# Altium footprint library IC.PcbLib: 386 footprints (part 19 of 30)
Each footprint in its own frame and in the unit in brackets; x right, y up, seen from the top. Pads: shape width x height; smd on the part's side, far side on the other; paste and mask are expansions set on the pad; w line width, h text height; cw(c..) or ccw(c..) is an arc to the next point about the centre after c.
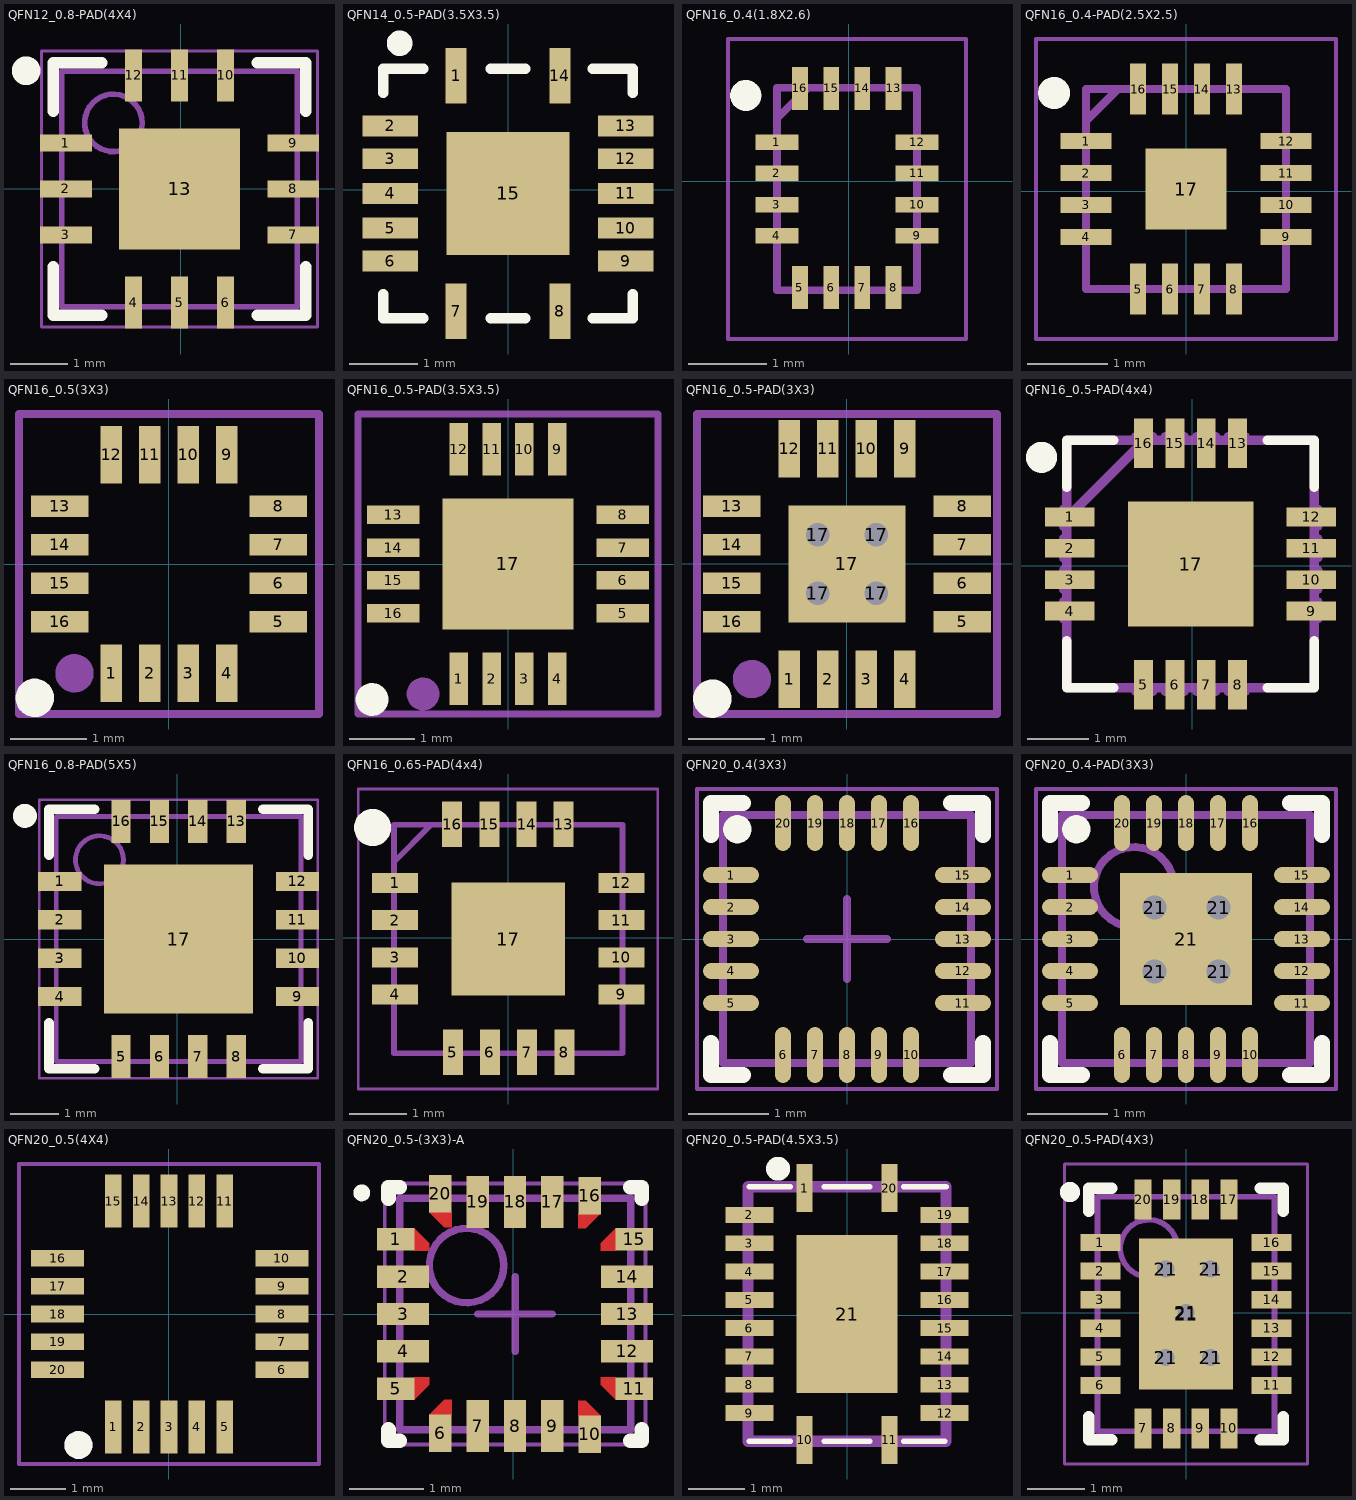
[diagram p18: the footprints below, top view; thin cyan lines are the x and y axes]

## QFN12_0.8-PAD(4X4) [mm]
height 0.254
pads (13):
  rect 0.9x0.3 smd: 1(-2.002,0.8) 2(-2.002,0) 3(-2.002,-0.8) 7(1.951,-0.8) 8(1.951,0) 9(1.951,0.8)
  rect 0.3x0.9 smd: 4(-0.825,-1.976) 5(-0.025,-1.976) 6(0.775,-1.976) 10(0.775,1.976) 11(-0.025,1.976) 12(-0.825,1.976)
  rect 2.1x2.1 smd: 13(-0.025,0)
Top Overlay:
  circle w0.25: c-2.692,2.057 r0.125
  lines w0.2: -2.225,-1.35 -2.225,-2.2 -1.375,-2.2 ; -2.225,1.35 -2.225,2.2 -1.375,2.2 ; 1.325,-2.2 2.175,-2.2 2.175,-1.35 ; 1.325,2.2 2.175,2.2 2.175,1.35
Mechanical 13:
  circle w0.1: c-1.175,1.15 r0.5
  lines w0.1: -2.075,-2.05 -2.075,2.05 2.025,2.05 2.025,-2.05 -2.075,-2.05
Mechanical 15:
  lines w0.05: -2.425,-2.4 -2.425,2.4 2.375,2.4 2.375,-2.4 -2.425,-2.4
  lines w0.1: -0.525,0 0.475,0 ; -0.025,-0.5 -0.025,0.5
3D body "QFN80P400X400X80_HS-13N.step": height 0.8, standoff 0, extent -2.035,-2.01 1.985,2.01

## QFN14_0.5-PAD(3.5X3.5) [mil]
pads (15):
  rect 12x32 smd: 1(-30,66) 7(-30,-70) 8(30,-70) 14(30,66)
  rect 32x12 smd: 2(-68,37) 3(-68,18) 4(-68,-2) 5(-68,-22) 6(-68,-41) 9(68,-41) 10(68,-22) 11(68,-2) 12(68,18) 13(68,37)
  rect 71x71 smd: 15(0,-2)
Top Overlay:
  circle w9.84: c-62.57,84.7 r2.45
  lines w6: -72,-60 -72,-74 -49,-74 ; -72,56 -72,70 -49,70 ; -10,-74 10,-74 ; -10,70 10,70 ; 49,-74 72,-74 72,-60 ; 49,70 72,70 72,56
3D body: height 31.5, standoff 0, extent -70,-70 70,70
3D body: height 32.28, standoff 15.75, extent -59.76,40.18 -40.15,59.83

## QFN16_0.4(1.8X2.6) [mm]
pads (16):
  rect 0.55x0.2 smd: 1(-0.925,0.498) 2(-0.925,0.098) 3(-0.925,-0.302) 4(-0.925,-0.702) 9(0.875,-0.702) 10(0.875,-0.302) 11(0.875,0.098) 12(0.875,0.498)
  rect 0.2x0.55 smd: 5(-0.629,-1.368) 6(-0.229,-1.368) 7(0.171,-1.368) 8(0.571,-1.368) 13(0.571,1.19) 14(0.171,1.19) 15(-0.229,1.19) 16(-0.629,1.19)
Top Overlay:
  circle w0.2: c-1.325,1.098 r0.1
Mechanical 13:
  lines w0.1: -0.925,0.798 -0.525,1.198 ; -0.925,-1.402 -0.925,1.198 0.875,1.198 0.875,-1.402 -0.925,-1.402
Mechanical 15:
  lines w0.05: -1.55,-2.027 -1.55,1.823 1.5,1.823 1.5,-2.027 -1.55,-2.027
3D body "TS3A44159RSVR.stp": height 0.55, standoff 0, extent -0.975,-1.452 0.925,1.248

## QFN16_0.4-PAD(2.5X2.5) [mm]
height 1
pads (17):
  rect 0.635x0.2 smd: 1(-1.25,0.625) 2(-1.25,0.225) 3(-1.25,-0.175) 4(-1.25,-0.575) 9(1.25,-0.575) 10(1.25,-0.175) 11(1.25,0.225) 12(1.25,0.625)
  rect 0.2x0.635 smd: 5(-0.6,-1.225) 6(-0.2,-1.225) 7(0.2,-1.225) 8(0.6,-1.225) 13(0.6,1.275) 14(0.2,1.275) 15(-0.2,1.275) 16(-0.6,1.275)
  rect 1.016x1.016 smd: 17(0,0.025)
Top Overlay:
  circle w0.2: c-1.65,1.225 r0.1
Mechanical 13:
  lines w0.1: -1.25,0.875 -0.85,1.275 ; -1.25,-1.225 1.25,-1.225 1.25,1.275 -1.25,1.275 -1.25,-1.225
Mechanical 15:
  lines w0.05: -1.875,-1.85 1.875,-1.85 1.875,1.9 -1.875,1.9 -1.875,-1.85
3D body "SN74HC595BRWNR.stp": height 0.5, standoff 0, extent -1.3,-1.275 1.3,1.325

## QFN16_0.5(3X3) [mm]
pads (16):
  rect 0.28x0.75 smd mask+0.076: 1(-0.75,-1.425) 2(-0.25,-1.425) 3(0.25,-1.425) 4(0.75,-1.425) 9(0.75,1.425) 10(0.25,1.425) 11(-0.25,1.425) 12(-0.75,1.425)
  rect 0.75x0.28 smd mask+0.076: 5(1.425,-0.75) 6(1.425,-0.25) 7(1.425,0.25) 8(1.425,0.75) 13(-1.425,0.75) 14(-1.425,0.25) 15(-1.425,-0.25) 16(-1.425,-0.75)
Top Overlay:
  circle w0.25: c-1.75,-1.745 r0.125
Mechanical 15:
  circle w0.25: c-1.232,-1.425 r0.125
  lines w0.1: -1.956,-1.956 -1.956,1.956 1.956,1.956 1.956,-1.956 -1.956,-1.956
3D body "QFN16-3X3.STEP": height 0.9, standoff 0, extent -1.501,-1.501 1.501,1.501

## QFN16_0.5-PAD(3.5X3.5) [mm]
pads (17):
  rect 0.28x0.8 smd mask+0.076: 1(-0.75,-1.75) 2(-0.25,-1.75) 3(0.25,-1.75) 4(0.75,-1.75) 9(0.75,1.75) 10(0.25,1.75) 11(-0.25,1.75) 12(-0.75,1.75)
  rect 0.8x0.28 smd mask+0.076: 5(1.75,-0.75) 6(1.75,-0.25) 7(1.75,0.25) 8(1.75,0.75) 13(-1.75,0.75) 14(-1.75,0.25) 15(-1.75,-0.25) 16(-1.75,-0.75)
  rect 2x2 smd paste-5: 17(0,0)
Top Overlay:
  circle w0.25: c-2.072,-2.065 r0.125
Top Paste:
  region: 0.94,-0.94 0.94,-0.152 0.152,-0.152 0.152,-0.94
  region: 0.152,0.94 0.152,0.152 0.94,0.152 0.94,0.94
  region: -0.94,0.94 -0.94,0.152 -0.152,0.152 -0.152,0.94
  region: -0.152,-0.94 -0.152,-0.152 -0.94,-0.152 -0.94,-0.94
Mechanical 15:
  circle w0.25: c-1.295,-1.981 r0.125
  lines w0.1: -0.5,0 0.5,0 ; 0,-0.5 0,0.5 ; -2.286,-2.286 -2.286,2.286 2.286,2.286 2.286,-2.286 -2.286,-2.286
3D body "VQFN16-3.5X3.5.STEP": height 1, standoff 0, extent -1.8,-1.8 1.8,1.8

## QFN16_0.5-PAD(3X3) [mm] "QFN, 16-Leads, Body 3.0x3.0mm (max), Pitch 0.50mm, IPC Low Density"
height 0.9
pads (21):
  rect 0.28x0.75 smd mask+0.076: 1(-0.75,-1.5) 2(-0.25,-1.5) 3(0.25,-1.5) 4(0.75,-1.5) 9(0.75,1.5) 10(0.25,1.5) 11(-0.25,1.5) 12(-0.75,1.5)
  rect 0.75x0.28 smd mask+0.076: 5(1.5,-0.75) 6(1.5,-0.25) 7(1.5,0.25) 8(1.5,0.75) 13(-1.5,0.75) 14(-1.5,0.25) 15(-1.5,-0.25) 16(-1.5,-0.75)
  round 0.61 hole 0.305: 17(-0.381,-0.381) 17(-0.381,0.381) 17(0.381,-0.381) 17(0.381,0.381)
  rect 1.524x1.524 smd paste-2: 17(0,0)
Top Overlay:
  circle w0.25: c-1.755,-1.755 r0.125
Top Paste:
  region: 0.125,0.762 0.125,0.125 0.762,0.125 0.762,0.762
  region: 0.762,-0.762 0.762,-0.125 0.125,-0.125 0.125,-0.762
  region: -0.125,-0.762 -0.125,-0.125 -0.762,-0.125 -0.762,-0.762
  region: -0.762,0.762 -0.762,0.125 -0.125,0.125 -0.125,0.762
Mechanical 15:
  circle w0.25: c-1.24,-1.5 r0.125
  lines w0.1: -0.5,0 0.5,0 ; 0,-0.5 0,0.5 ; -1.956,-1.956 -1.956,1.956 1.956,1.956 1.956,-1.956 -1.956,-1.956
3D body "QFN16-3X3.STEP": height 0.9, standoff 0, extent -1.501,-1.501 1.501,1.501

## QFN16_0.5-PAD(4x4) [mil]
height 35.43
pads (17):
  rect 31.5x12 smd: 1(-78,31) 2(-78,11) 3(-78,-9) 4(-78,-29) 9(76,-29) 10(76,-9) 11(76,11) 12(76,31)
  rect 12x31.5 smd: 5(-31,-76) 6(-11,-76) 7(9,-76) 8(29,-76) 13(29,78) 14(9,78) 15(-11,78) 16(-31,78)
  rect 80x80 smd: 17(-1,1)
Top Overlay:
  circle w12.8: c-96,69 r3.52
  lines w6: -80,-48 -80,-78 -50,-78 ; -80,50 -80,80 -50,80 ; 48,-78 78,-78 78,-48 ; 48,80 78,80 78,50
Mechanical 13:
  lines w6: -80,30 -30,80 ; -82,-34 -82,-23 -80,-23 -80,-34 -82,-34 ; -82,-15 -82,-3 -80,-3 -80,-15 -82,-15 ; -82,5 -82,17 -80,17 -80,5 -82,5 ; -82,25 -82,36 -80,36 -80,25 -82,25 ; -80,-78 78,-78 78,80 -80,80 -80,-78 ; -36,-80 -36,-78 -25,-78 -25,-80 -36,-80 ; -36,80 -25,80 -25,82 -36,82 -36,80 ; -17,-80 -17,-78 -5,-78 -5,-80 -17,-80 ; -17,80 -5,80 -5,82 -17,82 -17,80 ; 3,-80 3,-78 15,-78 15,-80 3,-80 ; 3,80 15,80 15,82 3,82 3,80 ; 23,-80 23,-78 34,-78 34,-80 23,-80 ; 23,80 34,80 34,82 23,82 23,80 ; 78,-34 78,-23 80,-23 80,-34 78,-34 ; 78,-15 78,-3 80,-3 80,-15 78,-15 ; 78,5 78,17 80,17 80,5 78,5 ; 78,25 78,36 80,36 80,25 78,25
3D body "BQ24650RVAT.stp": height 39.37, standoff 0, extent -71.86,-69.86 69.87,71.87

## QFN16_0.8-PAD(5X5) [mm]
height 0.254
pads (17):
  rect 0.9x0.4 smd: 1(-2.45,1.2) 2(-2.45,0.4) 3(-2.45,-0.4) 4(-2.45,-1.2) 9(2.501,-1.2) 10(2.501,-0.4) 11(2.501,0.4) 12(2.501,1.2)
  rect 0.4x0.9 smd: 5(-1.175,-2.45) 6(-0.375,-2.45) 7(0.425,-2.45) 8(1.225,-2.45) 13(1.225,2.45) 14(0.425,2.45) 15(-0.375,2.45) 16(-1.175,2.45)
  rect 3.1x3.1 smd: 17(0.025,0)
Top Overlay:
  circle w0.25: c-3.175,2.565 r0.125
  lines w0.2: -2.675,-1.75 -2.675,-2.7 -1.725,-2.7 ; -2.675,1.75 -2.675,2.7 -1.725,2.7 ; 1.775,-2.7 2.725,-2.7 2.725,-1.75 ; 1.775,2.7 2.725,2.7 2.725,1.75
Mechanical 13:
  circle w0.1: c-1.625,1.65 r0.5
  lines w0.1: -2.525,-2.55 -2.525,2.55 2.575,2.55 2.575,-2.55 -2.525,-2.55
Mechanical 15:
  lines w0.05: -2.875,-2.9 -2.875,2.9 2.925,2.9 2.925,-2.9 -2.875,-2.9
  lines w0.1: -0.475,0 0.525,0 ; 0.025,-0.5 0.025,0.5
3D body "User Library-QFN5x5_16pins.step": height 0.75, standoff 0, extent -2.495,-2.52 2.545,2.52

## QFN16_0.65-PAD(4x4) [mm] "QFN, 16-Leads, Body 3.0x3.0mm (max), Pitch 0.50mm, IPC Low Density"
height 0.9
pads (17):
  rect 0.8x0.35 smd: 1(-1.981,0.955) 2(-1.981,0.305) 3(-1.981,-0.345) 4(-1.981,-0.995) 9(1.981,-0.995) 10(1.981,-0.345) 11(1.981,0.305) 12(1.981,0.955)
  rect 0.35x0.8 smd: 5(-0.97,-2.007) 6(-0.32,-2.007) 7(0.33,-2.007) 8(0.98,-2.007) 13(0.97,1.981) 14(0.32,1.981) 15(-0.33,1.981) 16(-0.98,1.981)
  rect 1.981x1.981 smd: 17(0,-0.025)
Top Overlay:
  circle w0.325: c-2.375,1.925 r0.162
Mechanical 13:
  lines w0.1: -2,1.325 -1.35,1.975 ; -2,-2.025 -2,1.975 2,1.975 2,-2.025 -2,-2.025
Mechanical 15:
  lines w0.05: -2.625,-2.65 -2.625,2.6 2.616,2.6 2.616,-2.65 -2.625,-2.65
3D body "DRV8833RTYT.stp": height 0.8, standoff 0, extent -2.05,-2.075 2.05,2.025

## QFN20_0.4(3X3) [mm]
pads (20):
  oval 0.7x0.2 smd: 1(-1.45,0.8) 2(-1.45,0.4) 3(-1.45,0) 4(-1.45,-0.4) 5(-1.45,-0.8) 11(1.45,-0.8) 12(1.45,-0.4) 13(1.45,0) 14(1.45,0.4) 15(1.45,0.8)
  oval 0.2x0.7 smd: 6(-0.8,-1.45) 7(-0.4,-1.45) 8(0,-1.45) 9(0.4,-1.45) 10(0.8,-1.45) 16(0.8,1.45) 17(0.4,1.45) 18(0,1.45) 19(-0.4,1.45) 20(-0.8,1.45)
Top Overlay:
  circle w0.25: c-1.372,1.372 r0.051
  lines w0.2: -1.7,-1.3 -1.7,-1.7 -1.3,-1.7 ; -1.7,1.3 -1.7,1.7 -1.3,1.7 ; 1.3,-1.7 1.7,-1.7 1.7,-1.3 ; 1.3,1.7 1.7,1.7 1.7,1.3
Mechanical 13:
  lines w0.1: -1.55,-1.55 1.55,-1.55 1.55,1.55 -1.55,1.55 -1.55,-1.55
Mechanical 15:
  lines w0.05: -1.875,-1.875 1.875,-1.875 1.875,1.875 -1.875,1.875 -1.875,-1.875
  lines w0.1: -0.5,0 0.5,0 ; 0,-0.5 0,0.5
3D body "User Library-QFN40P300X300X60-20.step": height 0.6, standoff 0, extent -1.55,-1.55 1.55,1.55

## QFN20_0.4-PAD(3X3) [mm]
pads (25):
  oval 0.7x0.2 smd: 1(-1.45,0.8) 2(-1.45,0.4) 3(-1.45,0) 4(-1.45,-0.4) 5(-1.45,-0.8) 11(1.45,-0.8) 12(1.45,-0.4) 13(1.45,0) 14(1.45,0.4) 15(1.45,0.8)
  oval 0.2x0.7 smd: 6(-0.8,-1.45) 7(-0.4,-1.45) 8(0,-1.45) 9(0.4,-1.45) 10(0.8,-1.45) 16(0.8,1.45) 17(0.4,1.45) 18(0,1.45) 19(-0.4,1.45) 20(-0.8,1.45)
  round 0.6 hole 0.3: 21(-0.394,-0.406) 21(-0.394,0.394) 21(0.406,-0.406) 21(0.406,0.394)
  rect 1.65x1.65 smd: 21(0,0)
Top Overlay:
  circle w0.25: c-1.372,1.372 r0.051
  lines w0.2: -1.7,-1.3 -1.7,-1.7 -1.3,-1.7 ; -1.7,1.3 -1.7,1.7 -1.3,1.7 ; 1.3,-1.7 1.7,-1.7 1.7,-1.3 ; 1.3,1.7 1.7,1.7 1.7,1.3
Mechanical 13:
  circle w0.1: c-0.65,0.65 r0.5
  lines w0.1: -1.55,-1.55 1.55,-1.55 1.55,1.55 -1.55,1.55 -1.55,-1.55
Mechanical 15:
  lines w0.05: -1.875,-1.875 1.875,-1.875 1.875,1.875 -1.875,1.875 -1.875,-1.875
  lines w0.1: -0.5,0 0.5,0 ; 0,-0.5 0,0.5
3D body "User Library-QFN-20-2.step": height 0.75, standoff 0, extent -1.51,-1.51 1.51,1.51

## QFN20_0.5(4X4) [mm]
pads (20):
  rect 0.3x0.95 smd paste-0.02: 1(-1,-2.025) 2(-0.5,-2.025) 3(0,-2.025) 4(0.5,-2.025) 5(1,-2.025) 11(1,2.025) 12(0.5,2.025) 13(0,2.025) 14(-0.5,2.025) 15(-1,2.025)
  rect 0.95x0.3 smd paste-0.02: 6(2.025,-1) 7(2.025,-0.5) 8(2.025,0) 9(2.025,0.5) 10(2.025,1) 16(-1.999,1) 17(-1.999,0.5) 18(-1.999,0) 19(-1.999,-0.5) 20(-1.999,-1)
Top Overlay:
  circle w0.25: c-1.626,-2.352 r0.125
Mechanical 15:
  circle w0.25: c-1.626,-2.352 r0.125
  lines w0.076: -2.692,-2.692 -2.692,2.692 2.692,2.692 2.692,-2.692 -2.692,-2.692
3D body "User Library-QFN20_4x4x0_8.step": height 0.78, standoff -0.02, extent -2.01,-2.01 2.01,2.01

## QFN20_0.5-(3X3)-A [mm]
pads (20):
  rect 0.5x0.3 smd paste+0 mask-0.15: 1(-1.575,1.003) 5(-1.575,-1.003) 11(1.626,-1.003) 15(1.626,1.003)
  rect 0.7x0.3 smd paste+0 mask+0.06: 2(-1.478,0.5) 3(-1.478,0) 4(-1.478,-0.5) 12(1.529,-0.5) 13(1.529,0) 14(1.529,0.5)
  rect 0.3x0.5 smd paste+0 mask-0.15: 6(-0.978,-1.6) 10(1.029,-1.613) 16(1.029,1.587) 20(-0.978,1.613)
  rect 0.3x0.7 smd paste+0 mask+0.06: 7(-0.475,-1.503) 8(0.025,-1.503) 9(0.525,-1.503) 17(0.525,1.503) 18(0.025,1.503) 19(-0.475,1.503)
Top Layer:
  region: 0.875,1.15 0.875,1.35 1.175,1.35 0.975,1.15
  region: -0.825,1.163 -0.825,1.363 -1.125,1.363 -0.925,1.163
  region: 1.175,0.85 1.375,0.85 1.375,1.15 1.175,0.95
  region: 0.875,-1.163 0.875,-1.363 1.175,-1.363 0.975,-1.163
  region: -1.125,-0.85 -1.325,-0.85 -1.325,-1.15 -1.125,-0.95
  region: 1.175,-0.85 1.375,-0.85 1.375,-1.15 1.175,-0.95
  region: -0.825,-1.15 -0.825,-1.35 -1.125,-1.35 -0.925,-1.15
  region: -1.125,0.85 -1.325,0.85 -1.325,1.15 -1.125,0.95
Top Overlay:
  circle w0.127: c-2.032,1.626 r0.05
  lines w0.2: -1.675,-1.55 -1.675,-1.7 -1.525,-1.7 ; -1.675,1.55 -1.675,1.7 -1.525,1.7 ; 1.575,-1.7 1.725,-1.7 1.725,-1.55 ; 1.575,1.7 1.725,1.7 1.725,1.55
Top Paste:
  region: -1.125,0.85 -1.325,0.85 -1.325,1.15 -1.125,0.95
  region: -0.825,-1.15 -0.825,-1.35 -1.125,-1.35 -0.925,-1.15
  region: 1.175,-0.85 1.375,-0.85 1.375,-1.15 1.175,-0.95
  region: -1.125,-0.85 -1.325,-0.85 -1.325,-1.15 -1.125,-0.95
  region: 1.175,0.85 1.375,0.85 1.375,1.15 1.175,0.95
  region: -0.825,1.163 -0.825,1.363 -1.125,1.363 -0.925,1.163
  region: 0.875,1.15 0.875,1.35 1.175,1.35 0.975,1.15
  region: 0.875,-1.163 0.875,-1.363 1.175,-1.363 0.975,-1.163
Top Solder:
  region: 1.235,-1.338 1.235,-1.918 0.815,-1.918 0.815,-1.103 1,-1.103
  region: 1.235,1.325 1.235,1.905 0.815,1.905 0.815,1.09 1,1.09
  region: -1.185,1.338 -1.185,1.918 -0.765,1.918 -0.765,1.103 -0.949,1.103
  region: 1.351,-1.21 1.943,-1.21 1.943,-0.79 1.115,-0.79 1.116,-0.975
  region: -1.185,-1.325 -1.185,-1.905 -0.765,-1.905 -0.765,-1.09 -0.949,-1.09
  region: 1.351,1.21 1.93,1.21 1.93,0.79 1.115,0.79 1.116,0.975
  region: -1.3,-1.21 -1.892,-1.21 -1.892,-0.79 -1.065,-0.79 -1.065,-0.975
  region: -1.3,1.21 -1.88,1.21 -1.88,0.79 -1.065,0.79 -1.065,0.975
Mechanical 13:
  circle w0.1: c-0.625,0.65 r0.5
  lines w0.1: -1.525,-1.55 -1.525,1.55 1.575,1.55 1.575,-1.55 -1.525,-1.55
Mechanical 15:
  lines w0.05: -1.725,-1.75 -1.725,1.75 1.775,1.75 1.775,-1.75 -1.725,-1.75
  lines w0.1: -0.475,0 0.525,0 ; 0.025,-0.5 0.025,0.5
3D body: height 0.65, standoff 0.4, extent -1.321,0.766 -0.823,1.266
3D body: height 0.6, standoff 0, extent -1.525,-1.55 1.575,1.55

## QFN20_0.5-PAD(4.5X3.5) [mm]
pads (21):
  rect 0.28x0.85 smd: 1(-0.75,2.25) 10(-0.75,-2.2) 11(0.75,-2.2) 20(0.75,2.25)
  rect 0.85x0.28 smd: 2(-1.725,1.775) 3(-1.725,1.275) 4(-1.725,0.775) 5(-1.725,0.275) 6(-1.725,-0.225) 7(-1.725,-0.725) 8(-1.725,-1.225) 9(-1.725,-1.725) 12(1.725,-1.725) 13(1.725,-1.225) 14(1.725,-0.725) 15(1.725,-0.225) 16(1.725,0.275) 17(1.725,0.775) 18(1.725,1.275) 19(1.725,1.775)
  rect 1.778x2.794 smd: 21(0,0.025)
Top Overlay:
  circle w0.325: c-1.219,2.591 r0.049
  lines w0.1: -1.725,-2.225 -1,-2.225 ; -1.725,2.275 -1,2.275 ; -0.4,-2.225 0.4,-2.225 ; -0.4,2.275 0.4,2.275 ; 1,-2.225 1.725,-2.225 ; 1,2.275 1.75,2.275
Mechanical 13:
  lines w0.2: -1.75,-2.225 -1.75,2.275 1.75,2.275 1.75,-2.225 -1.75,-2.225
3D body: height 0.8, standoff 0, extent -1.75,-2.225 1.75,2.275
3D body: height 0.82, standoff 0.4, extent -1.316,1.508 -0.817,2.007

## QFN20_0.5-PAD(4X3) [mm]
pads (26):
  rect 0.7x0.3 smd: 1(-1.5,1.225) 2(-1.5,0.725) 3(-1.5,0.225) 4(-1.5,-0.275) 5(-1.5,-0.775) 6(-1.5,-1.275) 11(1.5,-1.275) 12(1.5,-0.775) 13(1.5,-0.275) 14(1.5,0.225) 15(1.5,0.725) 16(1.5,1.225)
  rect 0.3x0.7 smd: 7(-0.75,-2.025) 8(-0.25,-2.025) 9(0.25,-2.025) 10(0.75,-2.025) 17(0.75,1.975) 18(0.25,1.975) 19(-0.25,1.975) 20(-0.75,1.975)
  round 0.6 hole 0.3: 21(-0.356,-0.787) 21(-0.356,0.762) 21(0,0) 21(0.432,-0.787) 21(0.432,0.762)
  rect 1.65x2.65 smd: 21(0,-0.025)
Top Overlay:
  circle w0.25: c-2.032,2.108 r0.051
  lines w0.2: -1.7,-1.825 -1.7,-2.225 -1.3,-2.225 ; -1.7,1.775 -1.7,2.175 -1.3,2.175 ; 1.3,-2.225 1.7,-2.225 1.7,-1.825 ; 1.3,2.175 1.7,2.175 1.7,1.775
Mechanical 13:
  circle w0.1: c-0.65,1.125 r0.5
  lines w0.1: -1.55,-2.075 -1.55,2.025 1.55,2.025 1.55,-2.075 -1.55,-2.075
Mechanical 15:
  lines w0.05: -2.125,-2.65 -2.125,2.6 2.125,2.6 2.125,-2.65 -2.125,-2.65
  lines w0.1: -0.5,-0.025 0.5,-0.025 ; 0,-0.525 0,0.475
3D body "LTC6417CUDC#PBF.stp": height 0.8, standoff 0, extent -1.55,-2.075 1.55,2.025